# Altium schematic symbol library 13-Logic 数字 IC.SchLib: 324 symbols (part 1 of 30)
Pins are listed as number, name and electrical type; pins without a type are passive.

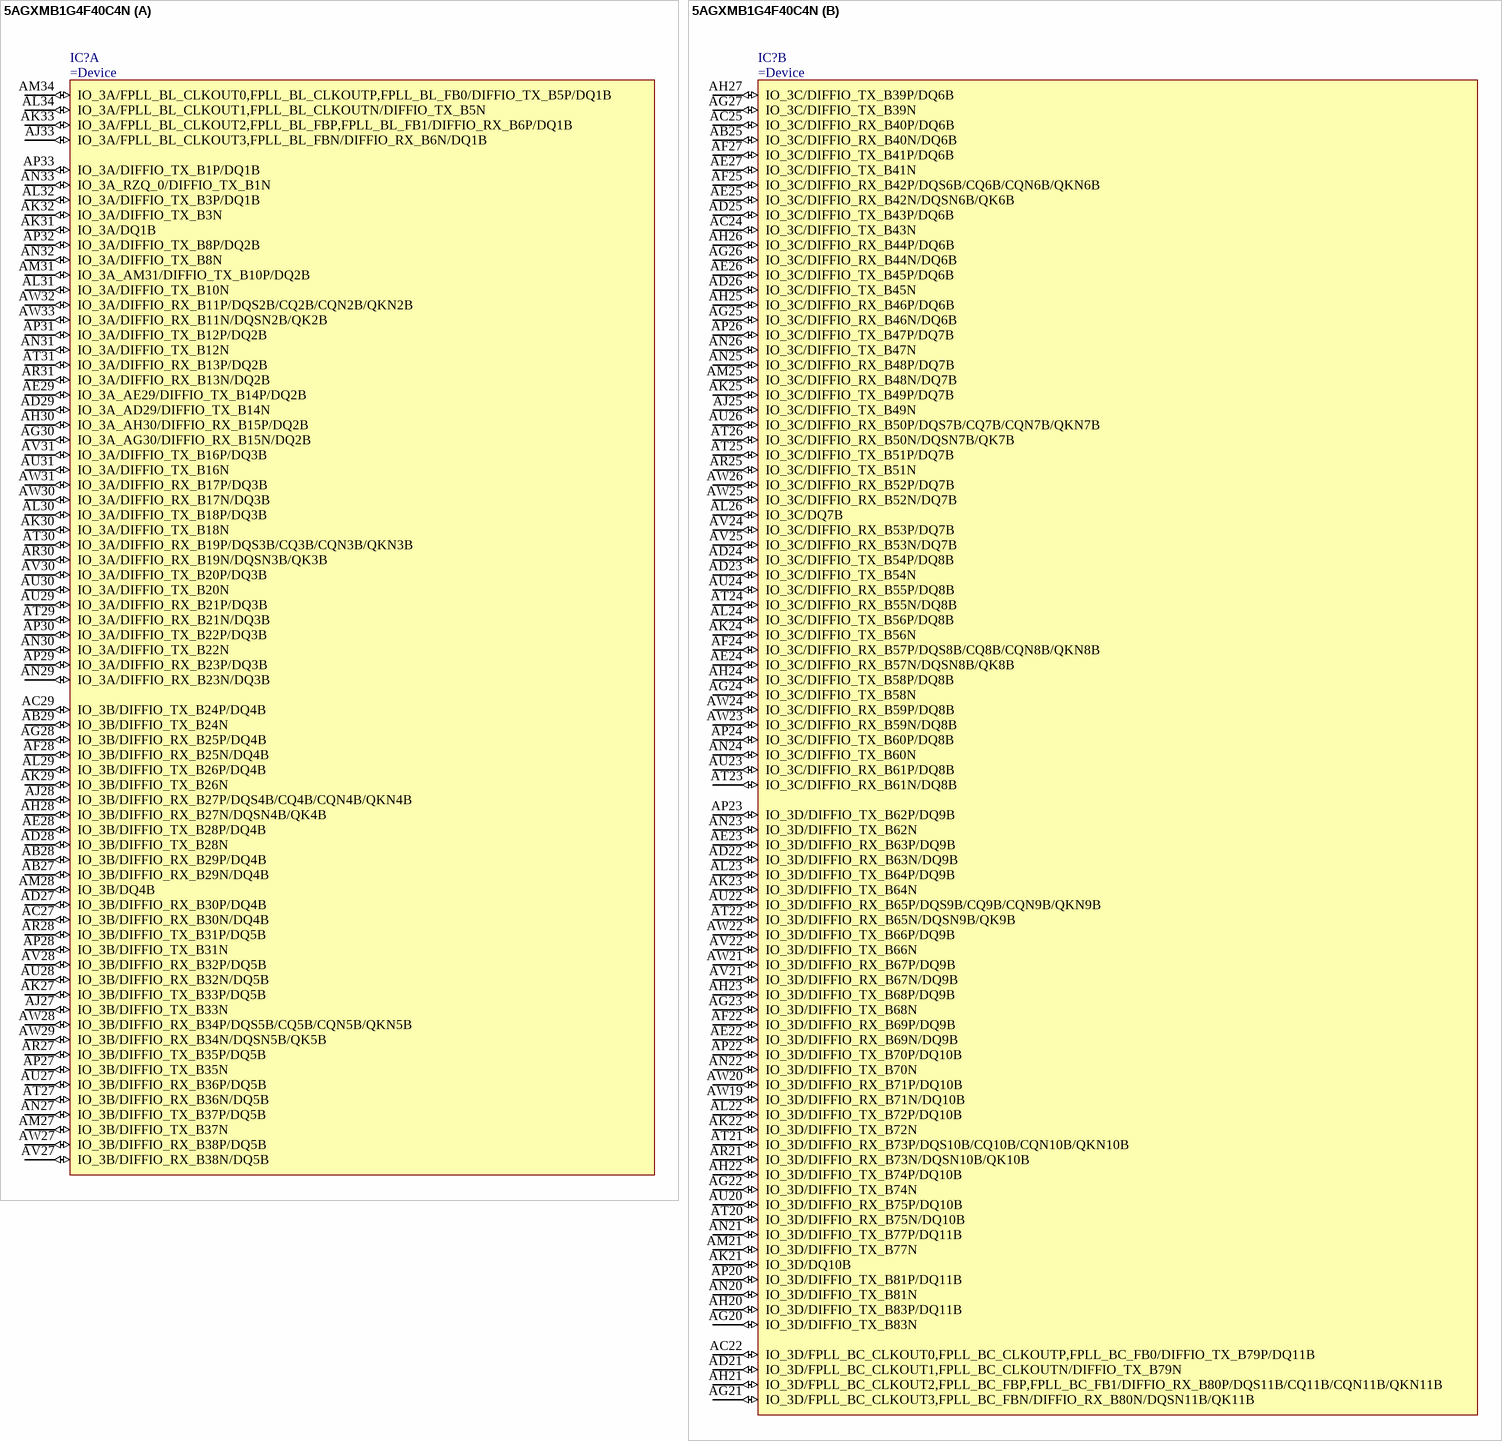
[diagram p0: symbol 5AGXMB1G4F40C4N]

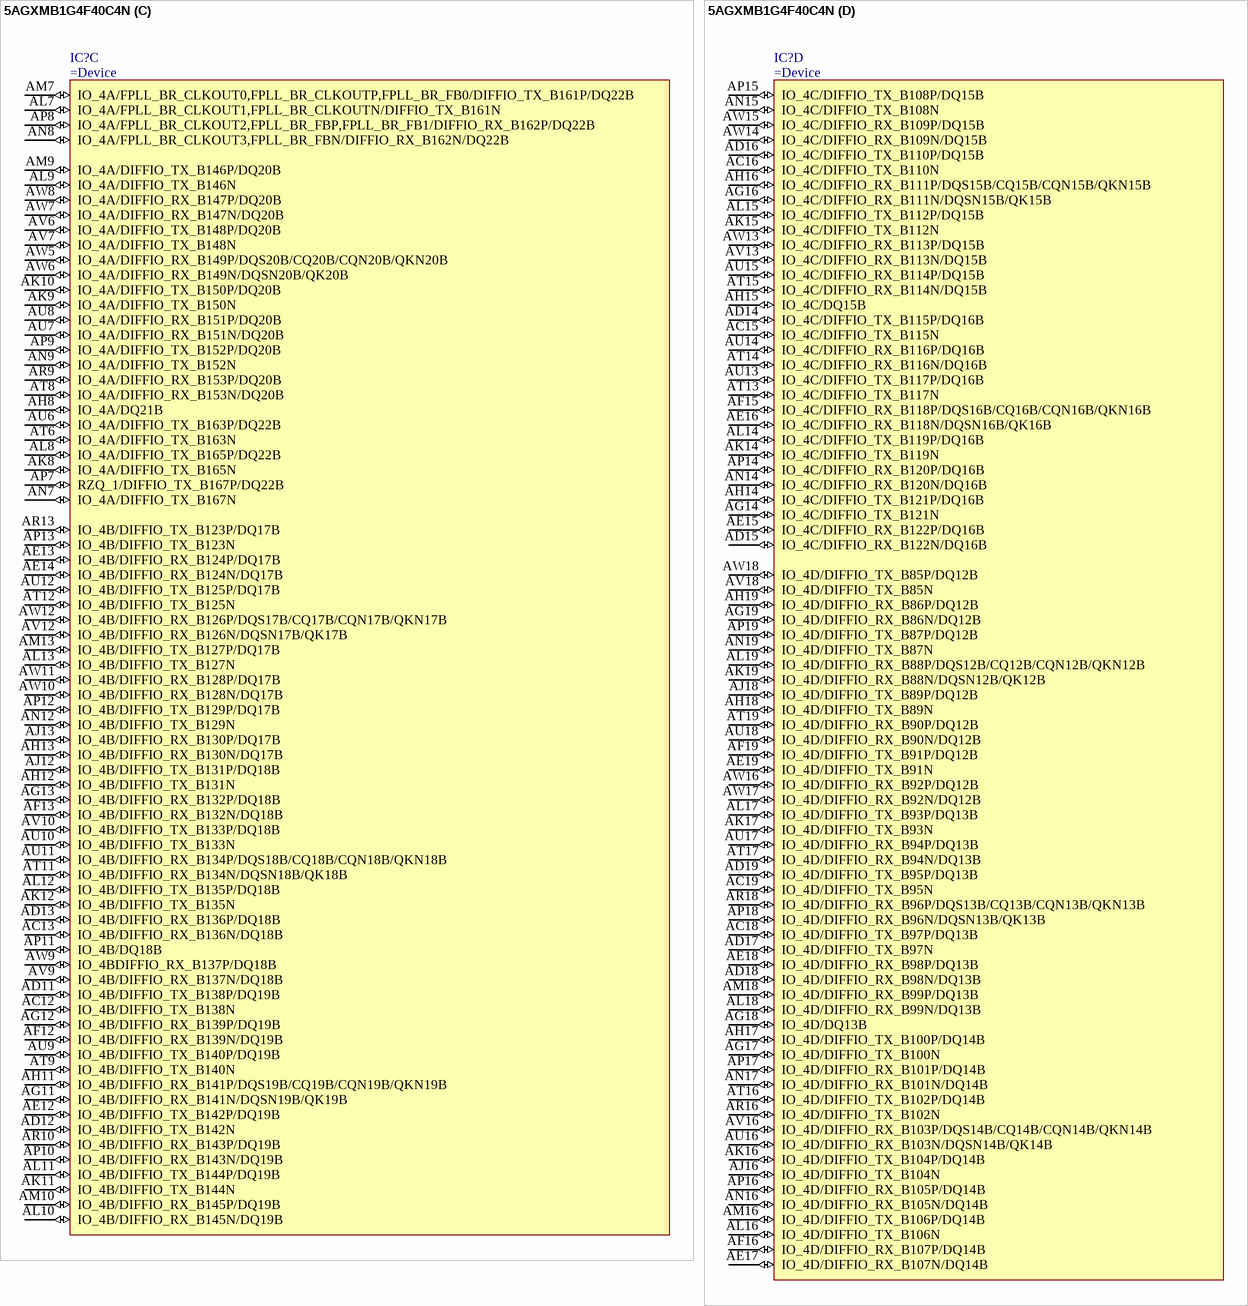
[diagram p1: symbol 5AGXMB1G4F40C4N]

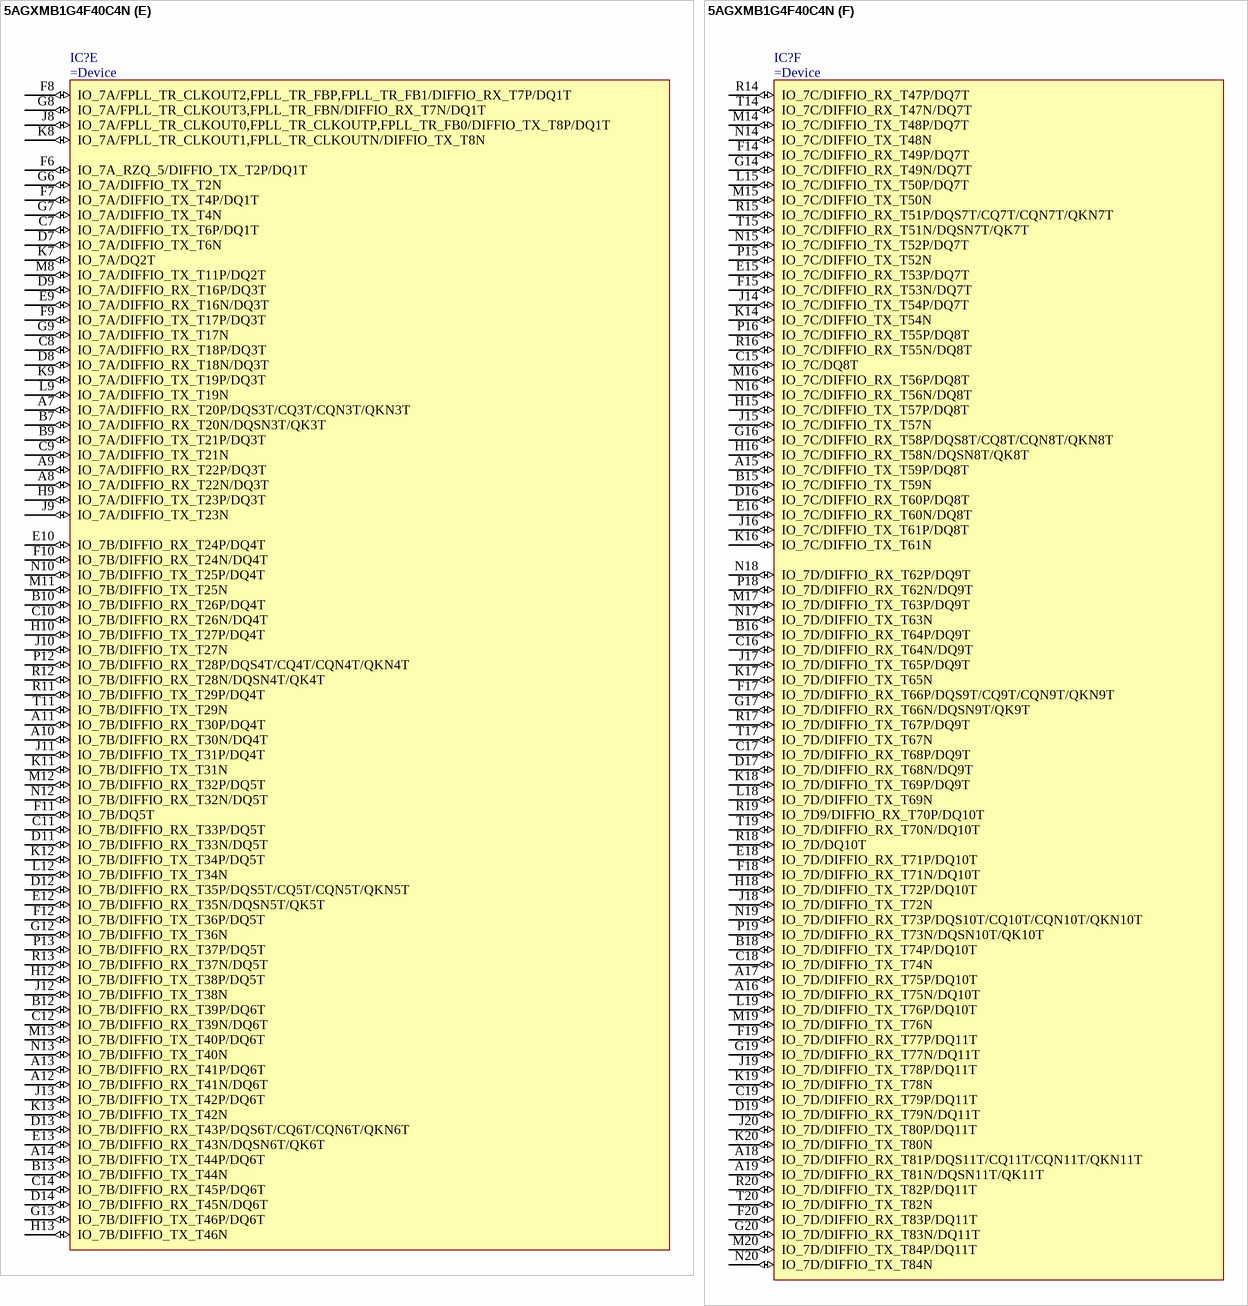
[diagram p2: symbol 5AGXMB1G4F40C4N]

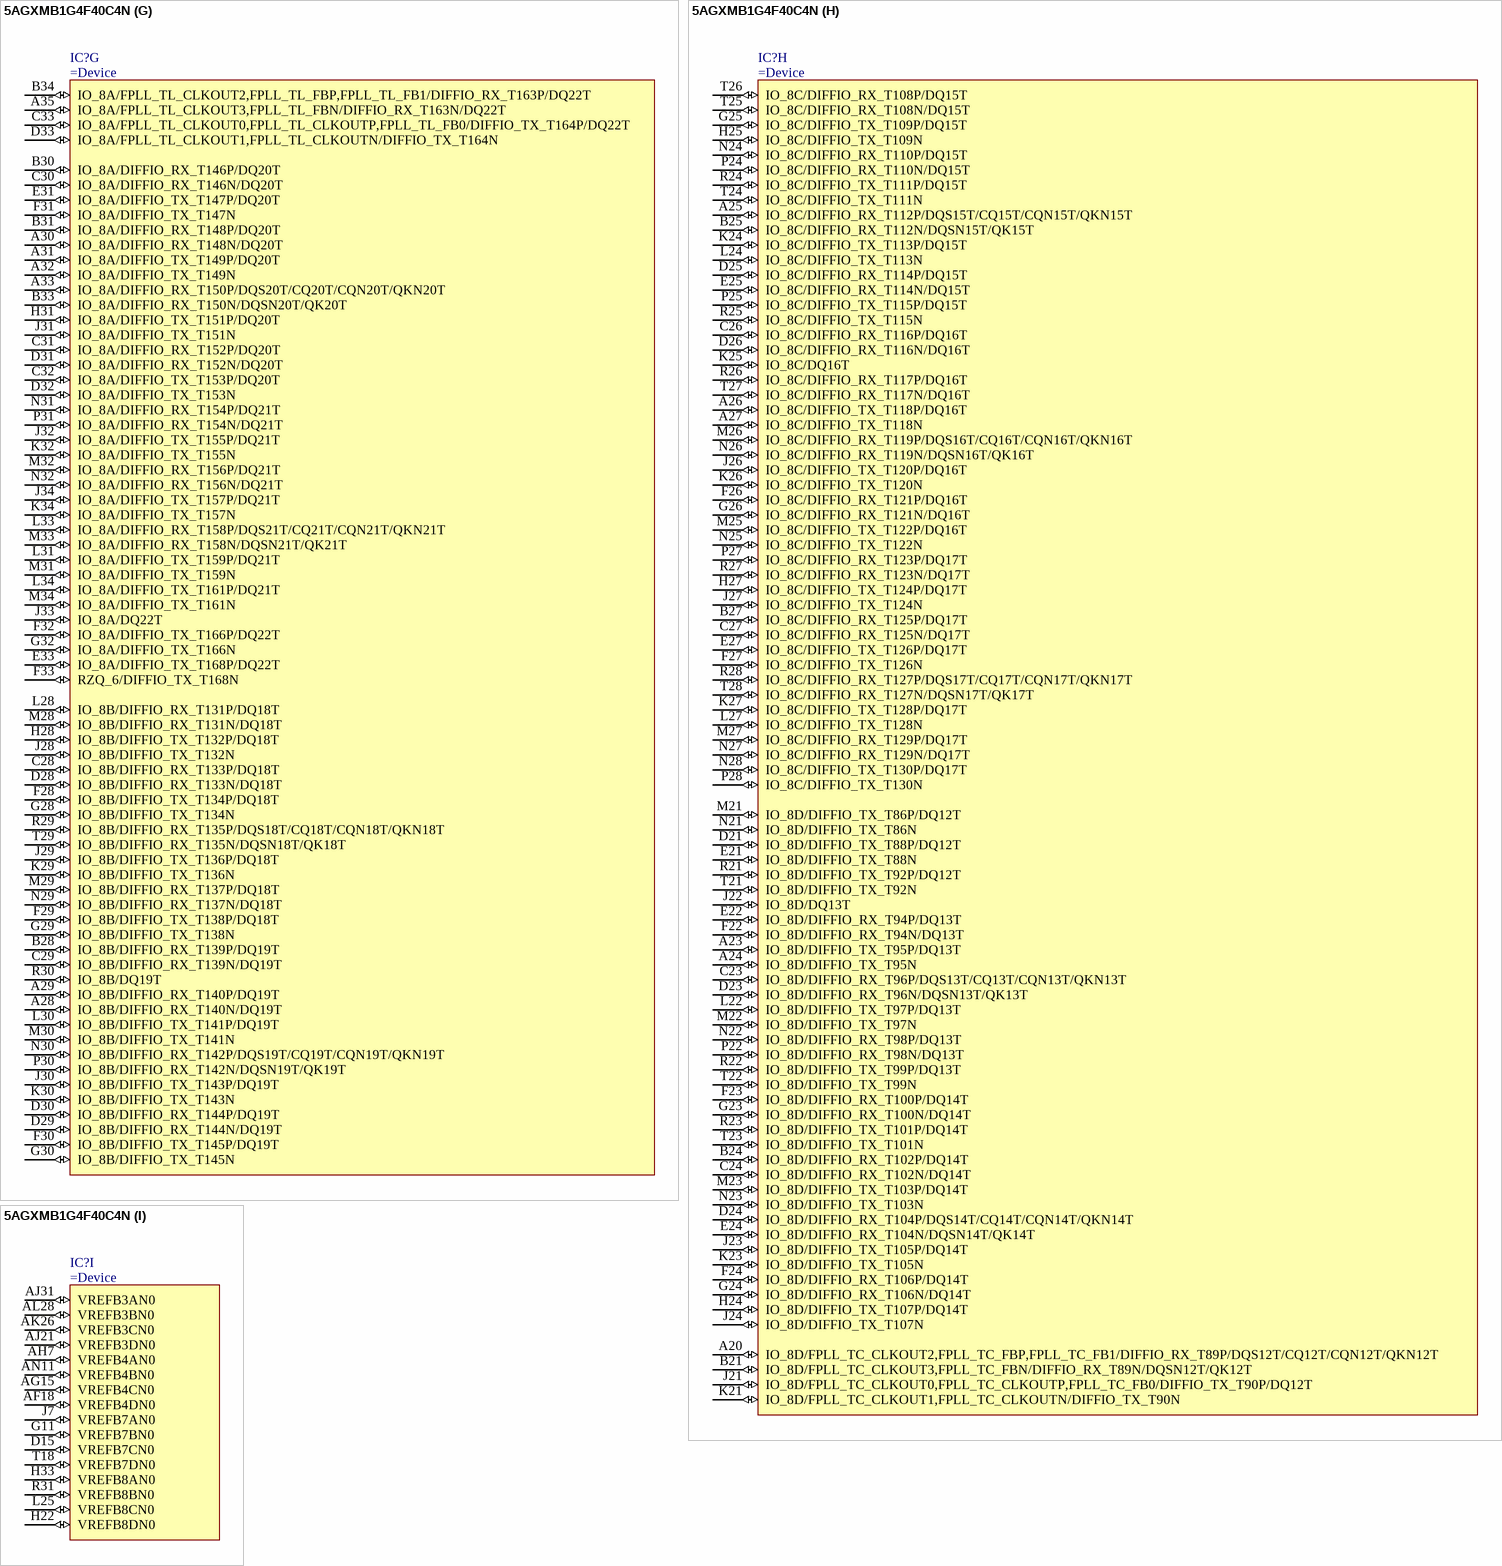
[diagram p3: symbol 5AGXMB1G4F40C4N]

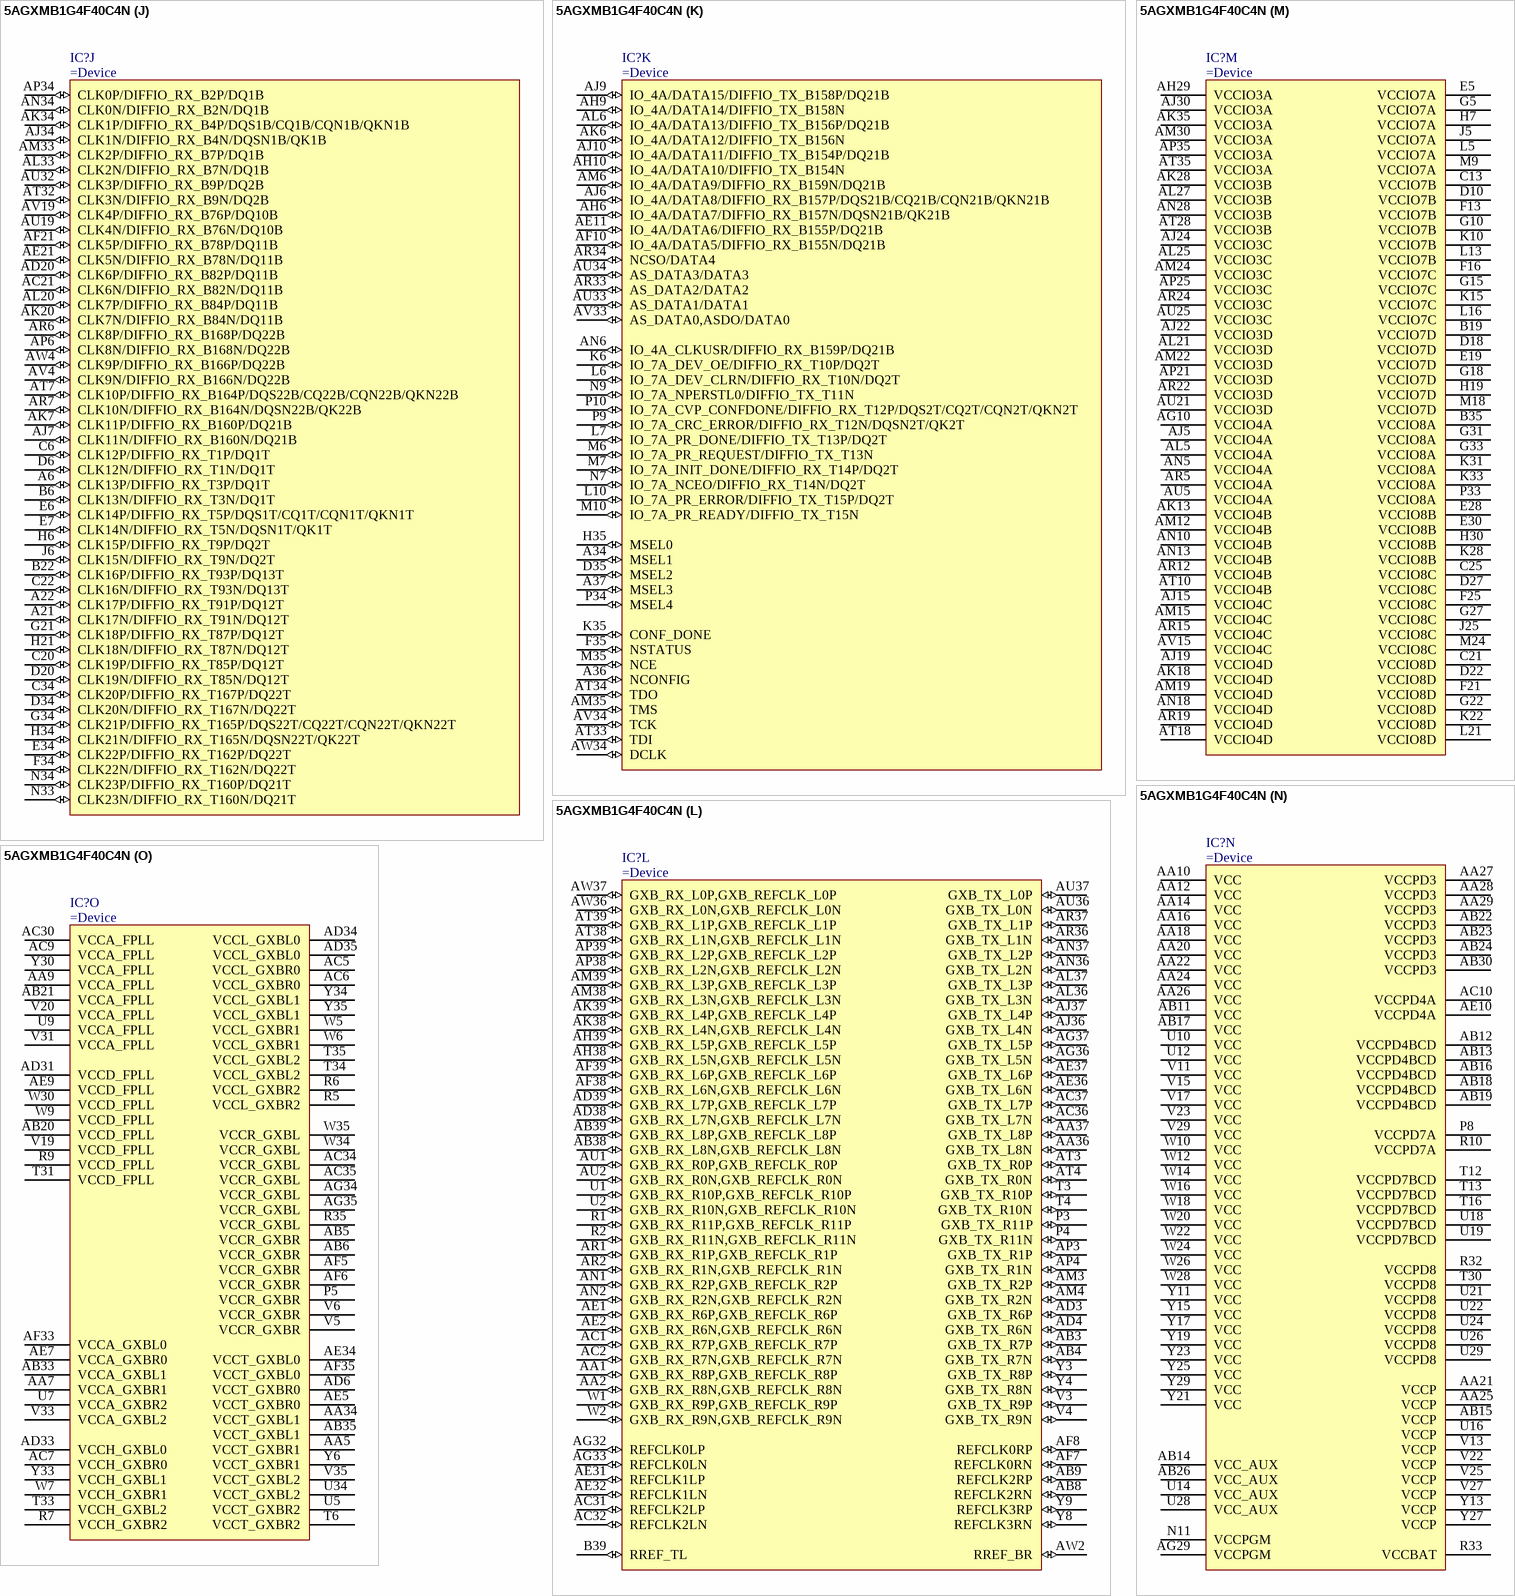
[diagram p4: symbol 5AGXMB1G4F40C4N]

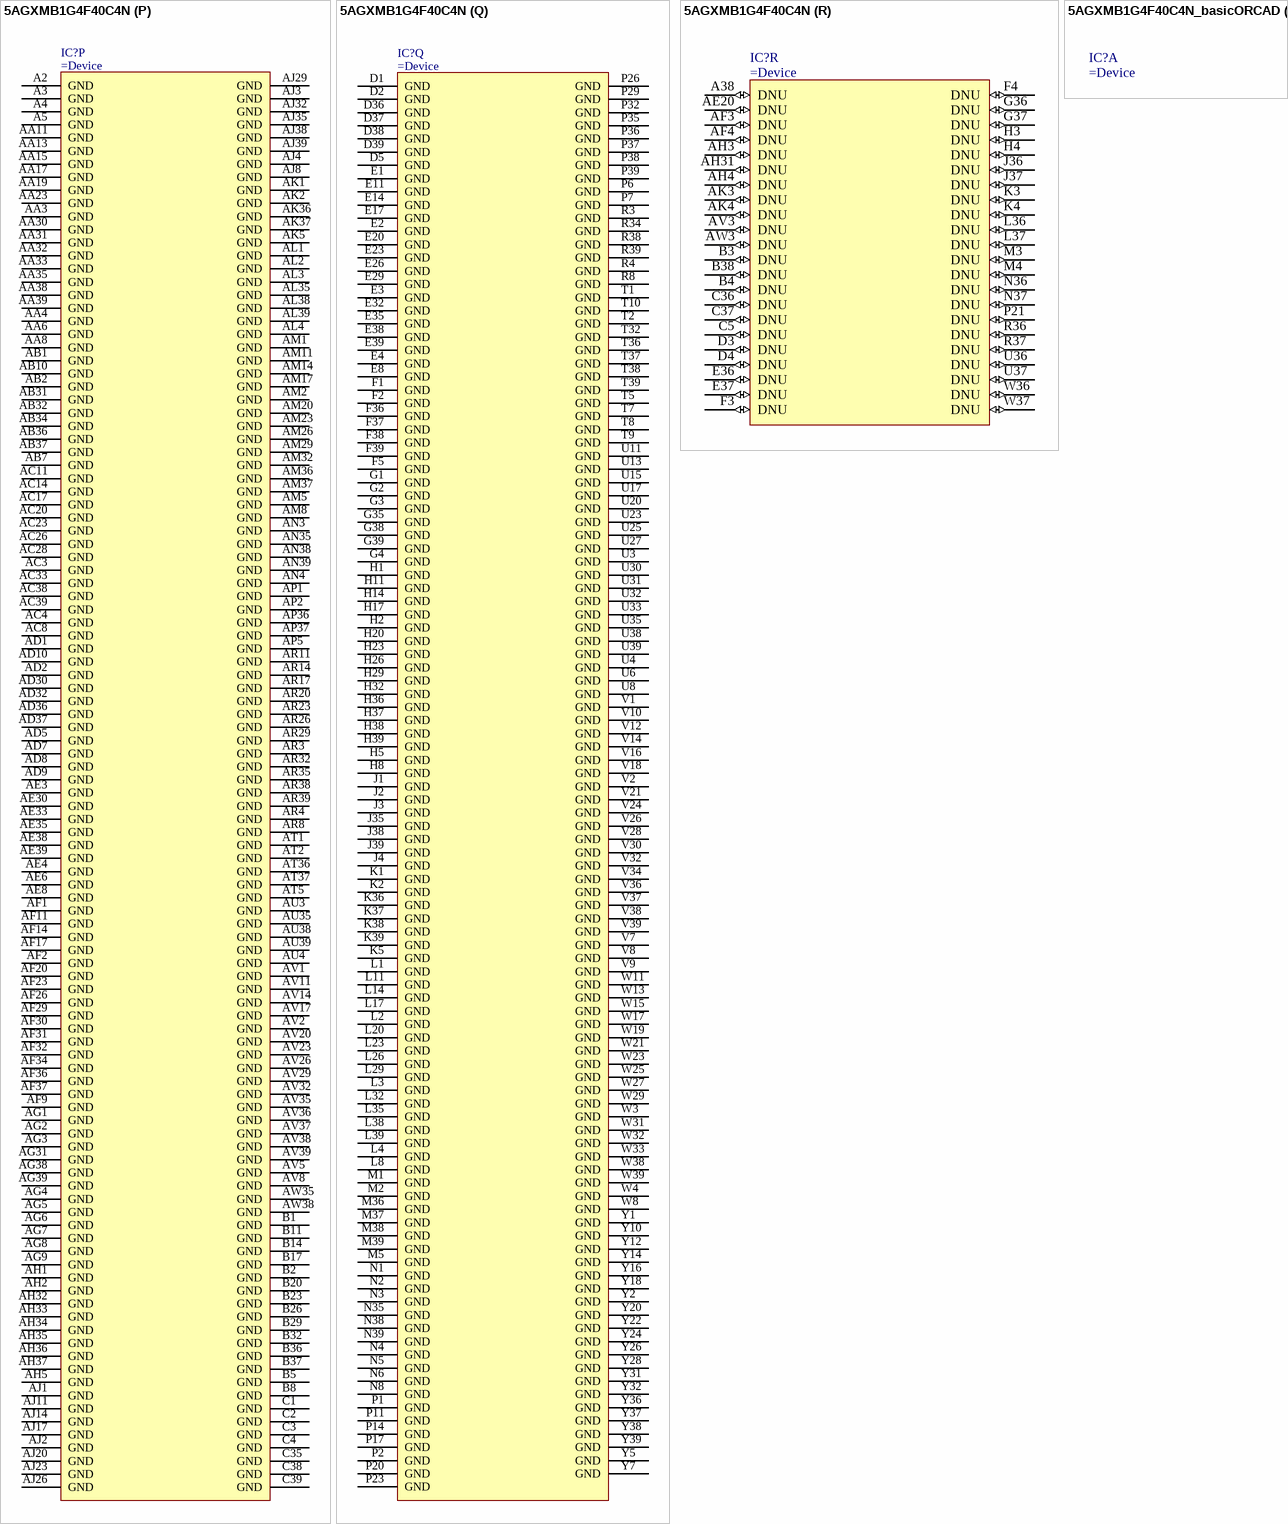
[diagram p5: symbols 5AGXMB1G4F40C4N to 5AGXMB1G4F40C4N_basicORCAD]

## 5AGXMB1G4F40C4N
designator IC?
Arria V GX Familly FPGA, 300k Logic Elements, 1517-Pin BGA, Speed Grade 4, Commercial Temperature Grade, Pb-Free
part A pins: AB27 IO_3B/DIFFIO_RX_B29N/DQ4B (io), AB28 IO_3B/DIFFIO_RX_B29P/DQ4B (io), AB29 IO_3B/DIFFIO_TX_B24N (io), AC27 IO_3B/DIFFIO_RX_B30N/DQ4B (io), AC29 IO_3B/DIFFIO_TX_B24P/DQ4B (io), AD27 IO_3B/DIFFIO_RX_B30P/DQ4B (io), AD28 IO_3B/DIFFIO_TX_B28N (io), AD29 IO_3A_AD29/DIFFIO_TX_B14N (io), AE28 IO_3B/DIFFIO_TX_B28P/DQ4B (io), AE29 IO_3A_AE29/DIFFIO_TX_B14P/DQ2B (io), AF28 IO_3B/DIFFIO_RX_B25N/DQ4B (io), AG28 IO_3B/DIFFIO_RX_B25P/DQ4B (io), AG30 IO_3A_AG30/DIFFIO_RX_B15N/DQ2B (io), AH28 IO_3B/DIFFIO_RX_B27N/DQSN4B/QK4B (io), AH30 IO_3A_AH30/DIFFIO_RX_B15P/DQ2B (io), AJ27 IO_3B/DIFFIO_TX_B33N (io), AJ28 IO_3B/DIFFIO_RX_B27P/DQS4B/CQ4B/CQN4B/QKN4B (io), AJ33 IO_3A/FPLL_BL_CLKOUT3,FPLL_BL_FBN/DIFFIO_RX_B6N/DQ1B (io), AK27 IO_3B/DIFFIO_TX_B33P/DQ5B (io), AK29 IO_3B/DIFFIO_TX_B26N (io), AK30 IO_3A/DIFFIO_TX_B18N (io), AK31 IO_3A/DQ1B (io), AK32 IO_3A/DIFFIO_TX_B3N (io), AK33 IO_3A/FPLL_BL_CLKOUT2,FPLL_BL_FBP,FPLL_BL_FB1/DIFFIO_RX_B6P/DQ1B (io), AL29 IO_3B/DIFFIO_TX_B26P/DQ4B (io), AL30 IO_3A/DIFFIO_TX_B18P/DQ3B (io), AL31 IO_3A/DIFFIO_TX_B10N (io), AL32 IO_3A/DIFFIO_TX_B3P/DQ1B (io), AL34 IO_3A/FPLL_BL_CLKOUT1,FPLL_BL_CLKOUTN/DIFFIO_TX_B5N (io), AM27 IO_3B/DIFFIO_TX_B37N (io), AM28 IO_3B/DQ4B (io), AM31 IO_3A_AM31/DIFFIO_TX_B10P/DQ2B (io), AM34 IO_3A/FPLL_BL_CLKOUT0,FPLL_BL_CLKOUTP,FPLL_BL_FB0/DIFFIO_TX_B5P/DQ1B (io), AN27 IO_3B/DIFFIO_TX_B37P/DQ5B (io), AN29 IO_3A/DIFFIO_RX_B23N/DQ3B (io), AN30 IO_3A/DIFFIO_TX_B22N (io), AN31 IO_3A/DIFFIO_TX_B12N (io), AN32 IO_3A/DIFFIO_TX_B8N (io), AN33 IO_3A_RZQ_0/DIFFIO_TX_B1N (io), AP27 IO_3B/DIFFIO_TX_B35N (io), AP28 IO_3B/DIFFIO_TX_B31N (io), AP29 IO_3A/DIFFIO_RX_B23P/DQ3B (io), AP30 IO_3A/DIFFIO_TX_B22P/DQ3B (io), AP31 IO_3A/DIFFIO_TX_B12P/DQ2B (io), AP32 IO_3A/DIFFIO_TX_B8P/DQ2B (io), AP33 IO_3A/DIFFIO_TX_B1P/DQ1B (io), AR27 IO_3B/DIFFIO_TX_B35P/DQ5B (io), AR28 IO_3B/DIFFIO_TX_B31P/DQ5B (io), AR30 IO_3A/DIFFIO_RX_B19N/DQSN3B/QK3B (io), AR31 IO_3A/DIFFIO_RX_B13N/DQ2B (io), AT27 IO_3B/DIFFIO_RX_B36N/DQ5B (io), AT29 IO_3A/DIFFIO_RX_B21N/DQ3B (io), AT30 IO_3A/DIFFIO_RX_B19P/DQS3B/CQ3B/CQN3B/QKN3B (io), AT31 IO_3A/DIFFIO_RX_B13P/DQ2B (io), AU27 IO_3B/DIFFIO_RX_B36P/DQ5B (io), AU28 IO_3B/DIFFIO_RX_B32N/DQ5B (io), AU29 IO_3A/DIFFIO_RX_B21P/DQ3B (io), AU30 IO_3A/DIFFIO_TX_B20N (io), AU31 IO_3A/DIFFIO_TX_B16N (io), AV27 IO_3B/DIFFIO_RX_B38N/DQ5B (io), AV28 IO_3B/DIFFIO_RX_B32P/DQ5B (io), AV30 IO_3A/DIFFIO_TX_B20P/DQ3B (io), AV31 IO_3A/DIFFIO_TX_B16P/DQ3B (io), AW27 IO_3B/DIFFIO_RX_B38P/DQ5B (io), AW28 IO_3B/DIFFIO_RX_B34P/DQS5B/CQ5B/CQN5B/QKN5B (io), AW29 IO_3B/DIFFIO_RX_B34N/DQSN5B/QK5B (io), AW30 IO_3A/DIFFIO_RX_B17N/DQ3B (io), AW31 IO_3A/DIFFIO_RX_B17P/DQ3B (io), AW32 IO_3A/DIFFIO_RX_B11P/DQS2B/CQ2B/CQN2B/QKN2B (io), AW33 IO_3A/DIFFIO_RX_B11N/DQSN2B/QK2B (io)
part B pins: AB25 IO_3C/DIFFIO_RX_B40N/DQ6B (io), AC22 IO_3D/FPLL_BC_CLKOUT0,FPLL_BC_CLKOUTP,FPLL_BC_FB0/DIFFIO_TX_B79P/DQ11B (io), AC24 IO_3C/DIFFIO_TX_B43N (io), AC25 IO_3C/DIFFIO_RX_B40P/DQ6B (io), AD21 IO_3D/FPLL_BC_CLKOUT1,FPLL_BC_CLKOUTN/DIFFIO_TX_B79N (io), AD22 IO_3D/DIFFIO_RX_B63N/DQ9B (io), AD23 IO_3C/DIFFIO_TX_B54N (io), AD24 IO_3C/DIFFIO_TX_B54P/DQ8B (io), AD25 IO_3C/DIFFIO_TX_B43P/DQ6B (io), AD26 IO_3C/DIFFIO_TX_B45N (io), AE22 IO_3D/DIFFIO_RX_B69N/DQ9B (io), AE23 IO_3D/DIFFIO_RX_B63P/DQ9B (io), AE24 IO_3C/DIFFIO_RX_B57N/DQSN8B/QK8B (io), AE25 IO_3C/DIFFIO_RX_B42N/DQSN6B/QK6B (io), AE26 IO_3C/DIFFIO_TX_B45P/DQ6B (io), AE27 IO_3C/DIFFIO_TX_B41N (io), AF22 IO_3D/DIFFIO_RX_B69P/DQ9B (io), AF24 IO_3C/DIFFIO_RX_B57P/DQS8B/CQ8B/CQN8B/QKN8B (io), AF25 IO_3C/DIFFIO_RX_B42P/DQS6B/CQ6B/CQN6B/QKN6B (io), AF27 IO_3C/DIFFIO_TX_B41P/DQ6B (io), AG20 IO_3D/DIFFIO_TX_B83N (io), AG21 IO_3D/FPLL_BC_CLKOUT3,FPLL_BC_FBN/DIFFIO_RX_B80N/DQSN11B/QK11B (io), AG22 IO_3D/DIFFIO_TX_B74N (io), AG23 IO_3D/DIFFIO_TX_B68N (io), AG24 IO_3C/DIFFIO_TX_B58N (io), AG25 IO_3C/DIFFIO_RX_B46N/DQ6B (io), AG26 IO_3C/DIFFIO_RX_B44N/DQ6B (io), AG27 IO_3C/DIFFIO_TX_B39N (io), AH20 IO_3D/DIFFIO_TX_B83P/DQ11B (io), AH21 IO_3D/FPLL_BC_CLKOUT2,FPLL_BC_FBP,FPLL_BC_FB1/DIFFIO_RX_B80P/DQS11B/CQ11B/CQN11B/QKN11B (io), AH22 IO_3D/DIFFIO_TX_B74P/DQ10B (io), AH23 IO_3D/DIFFIO_TX_B68P/DQ9B (io), AH24 IO_3C/DIFFIO_TX_B58P/DQ8B (io), AH25 IO_3C/DIFFIO_RX_B46P/DQ6B (io), AH26 IO_3C/DIFFIO_RX_B44P/DQ6B (io), AH27 IO_3C/DIFFIO_TX_B39P/DQ6B (io), AJ25 IO_3C/DIFFIO_TX_B49N (io), AK21 IO_3D/DQ10B (io), AK22 IO_3D/DIFFIO_TX_B72N (io), AK23 IO_3D/DIFFIO_TX_B64N (io), AK24 IO_3C/DIFFIO_TX_B56N (io), AK25 IO_3C/DIFFIO_TX_B49P/DQ7B (io), AL22 IO_3D/DIFFIO_TX_B72P/DQ10B (io), AL23 IO_3D/DIFFIO_TX_B64P/DQ9B (io), AL24 IO_3C/DIFFIO_TX_B56P/DQ8B (io), AL26 IO_3C/DQ7B (io), AM21 IO_3D/DIFFIO_TX_B77N (io), AM25 IO_3C/DIFFIO_RX_B48N/DQ7B (io), AN20 IO_3D/DIFFIO_TX_B81N (io), AN21 IO_3D/DIFFIO_TX_B77P/DQ11B (io), AN22 IO_3D/DIFFIO_TX_B70N (io), AN23 IO_3D/DIFFIO_TX_B62N (io), AN24 IO_3C/DIFFIO_TX_B60N (io), AN25 IO_3C/DIFFIO_RX_B48P/DQ7B (io), AN26 IO_3C/DIFFIO_TX_B47N (io), AP20 IO_3D/DIFFIO_TX_B81P/DQ11B (io), AP22 IO_3D/DIFFIO_TX_B70P/DQ10B (io), AP23 IO_3D/DIFFIO_TX_B62P/DQ9B (io), AP24 IO_3C/DIFFIO_TX_B60P/DQ8B (io), AP26 IO_3C/DIFFIO_TX_B47P/DQ7B (io), AR21 IO_3D/DIFFIO_RX_B73N/DQSN10B/QK10B (io), AR25 IO_3C/DIFFIO_TX_B51N (io), AT20 IO_3D/DIFFIO_RX_B75N/DQ10B (io), AT21 IO_3D/DIFFIO_RX_B73P/DQS10B/CQ10B/CQN10B/QKN10B (io), AT22 IO_3D/DIFFIO_RX_B65N/DQSN9B/QK9B (io), AT23 IO_3C/DIFFIO_RX_B61N/DQ8B (io), AT24 IO_3C/DIFFIO_RX_B55N/DQ8B (io), AT25 IO_3C/DIFFIO_TX_B51P/DQ7B (io), AT26 IO_3C/DIFFIO_RX_B50N/DQSN7B/QK7B (io), AU20 IO_3D/DIFFIO_RX_B75P/DQ10B (io), AU22 IO_3D/DIFFIO_RX_B65P/DQS9B/CQ9B/CQN9B/QKN9B (io), AU23 IO_3C/DIFFIO_RX_B61P/DQ8B (io), AU24 IO_3C/DIFFIO_RX_B55P/DQ8B (io), AU26 IO_3C/DIFFIO_RX_B50P/DQS7B/CQ7B/CQN7B/QKN7B (io), AV21 IO_3D/DIFFIO_RX_B67N/DQ9B (io), AV22 IO_3D/DIFFIO_TX_B66N (io), AV24 IO_3C/DIFFIO_RX_B53P/DQ7B (io), AV25 IO_3C/DIFFIO_RX_B53N/DQ7B (io), AW19 IO_3D/DIFFIO_RX_B71N/DQ10B (io), AW20 IO_3D/DIFFIO_RX_B71P/DQ10B (io), AW21 IO_3D/DIFFIO_RX_B67P/DQ9B (io), AW22 IO_3D/DIFFIO_TX_B66P/DQ9B (io), AW23 IO_3C/DIFFIO_RX_B59N/DQ8B (io), AW24 IO_3C/DIFFIO_RX_B59P/DQ8B (io), AW25 IO_3C/DIFFIO_RX_B52N/DQ7B (io), AW26 IO_3C/DIFFIO_RX_B52P/DQ7B (io)
part C pins: AC12 IO_4B/DIFFIO_TX_B138N (io), AC13 IO_4B/DIFFIO_RX_B136N/DQ18B (io), AD11 IO_4B/DIFFIO_TX_B138P/DQ19B (io), AD12 IO_4B/DIFFIO_TX_B142N (io), AD13 IO_4B/DIFFIO_RX_B136P/DQ18B (io), AE12 IO_4B/DIFFIO_TX_B142P/DQ19B (io), AE13 IO_4B/DIFFIO_RX_B124P/DQ17B (io), AE14 IO_4B/DIFFIO_RX_B124N/DQ17B (io), AF12 IO_4B/DIFFIO_RX_B139N/DQ19B (io), AF13 IO_4B/DIFFIO_RX_B132N/DQ18B (io), AG11 IO_4B/DIFFIO_RX_B141N/DQSN19B/QK19B (io), AG12 IO_4B/DIFFIO_RX_B139P/DQ19B (io), AG13 IO_4B/DIFFIO_RX_B132P/DQ18B (io), AH8 IO_4A/DQ21B (io), AH11 IO_4B/DIFFIO_RX_B141P/DQS19B/CQ19B/CQN19B/QKN19B (io), AH12 IO_4B/DIFFIO_TX_B131N (io), AH13 IO_4B/DIFFIO_RX_B130N/DQ17B (io), AJ12 IO_4B/DIFFIO_TX_B131P/DQ18B (io), AJ13 IO_4B/DIFFIO_RX_B130P/DQ17B (io), AK8 IO_4A/DIFFIO_TX_B165N (io), AK9 IO_4A/DIFFIO_TX_B150N (io), AK10 IO_4A/DIFFIO_TX_B150P/DQ20B (io), AK11 IO_4B/DIFFIO_TX_B144N (io), AK12 IO_4B/DIFFIO_TX_B135N (io), AL7 IO_4A/FPLL_BR_CLKOUT1,FPLL_BR_CLKOUTN/DIFFIO_TX_B161N (io), AL8 IO_4A/DIFFIO_TX_B165P/DQ22B (io), AL9 IO_4A/DIFFIO_TX_B146N (io), AL10 IO_4B/DIFFIO_RX_B145N/DQ19B (io), AL11 IO_4B/DIFFIO_TX_B144P/DQ19B (io), AL12 IO_4B/DIFFIO_TX_B135P/DQ18B (io), AL13 IO_4B/DIFFIO_TX_B127N (io), AM7 IO_4A/FPLL_BR_CLKOUT0,FPLL_BR_CLKOUTP,FPLL_BR_FB0/DIFFIO_TX_B161P/DQ22B (io), AM9 IO_4A/DIFFIO_TX_B146P/DQ20B (io), AM10 IO_4B/DIFFIO_RX_B145P/DQ19B (io), AM13 IO_4B/DIFFIO_TX_B127P/DQ17B (io), AN7 IO_4A/DIFFIO_TX_B167N (io), AN8 IO_4A/FPLL_BR_CLKOUT3,FPLL_BR_FBN/DIFFIO_RX_B162N/DQ22B (io), AN9 IO_4A/DIFFIO_TX_B152N (io), AN12 IO_4B/DIFFIO_TX_B129N (io), AP7 RZQ_1/DIFFIO_TX_B167P/DQ22B (io), AP8 IO_4A/FPLL_BR_CLKOUT2,FPLL_BR_FBP,FPLL_BR_FB1/DIFFIO_RX_B162P/DQ22B (io), AP9 IO_4A/DIFFIO_TX_B152P/DQ20B (io), AP10 IO_4B/DIFFIO_RX_B143N/DQ19B (io), AP11 IO_4B/DQ18B (io), AP12 IO_4B/DIFFIO_TX_B129P/DQ17B (io), AP13 IO_4B/DIFFIO_TX_B123N (io), AR9 IO_4A/DIFFIO_RX_B153P/DQ20B (io), AR10 IO_4B/DIFFIO_RX_B143P/DQ19B (io), AR13 IO_4B/DIFFIO_TX_B123P/DQ17B (io), AT6 IO_4A/DIFFIO_TX_B163N (io), AT8 IO_4A/DIFFIO_RX_B153N/DQ20B (io), AT9 IO_4B/DIFFIO_TX_B140N (io), AT11 IO_4B/DIFFIO_RX_B134N/DQSN18B/QK18B (io), AT12 IO_4B/DIFFIO_TX_B125N (io), AU6 IO_4A/DIFFIO_TX_B163P/DQ22B (io), AU7 IO_4A/DIFFIO_RX_B151N/DQ20B (io), AU8 IO_4A/DIFFIO_RX_B151P/DQ20B (io), AU9 IO_4B/DIFFIO_TX_B140P/DQ19B (io), AU10 IO_4B/DIFFIO_TX_B133N (io), AU11 IO_4B/DIFFIO_RX_B134P/DQS18B/CQ18B/CQN18B/QKN18B (io), AU12 IO_4B/DIFFIO_TX_B125P/DQ17B (io), AV6 IO_4A/DIFFIO_TX_B148P/DQ20B (io), AV7 IO_4A/DIFFIO_TX_B148N (io), AV9 IO_4B/DIFFIO_RX_B137N/DQ18B (io), AV10 IO_4B/DIFFIO_TX_B133P/DQ18B (io), AV12 IO_4B/DIFFIO_RX_B126N/DQSN17B/QK17B (io), AW5 IO_4A/DIFFIO_RX_B149P/DQS20B/CQ20B/CQN20B/QKN20B (io), AW6 IO_4A/DIFFIO_RX_B149N/DQSN20B/QK20B (io), AW7 IO_4A/DIFFIO_RX_B147N/DQ20B (io), AW8 IO_4A/DIFFIO_RX_B147P/DQ20B (io), AW9 IO_4BDIFFIO_RX_B137P/DQ18B (io), AW10 IO_4B/DIFFIO_RX_B128N/DQ17B (io), AW11 IO_4B/DIFFIO_RX_B128P/DQ17B (io), AW12 IO_4B/DIFFIO_RX_B126P/DQS17B/CQ17B/CQN17B/QKN17B (io)